# Altium schematic symbol library jlcpcb_2025_04_capacitors_extended_0603.schlib: 3668 symbols (part 15 of 20) (continued)
## GCM188R71E474KA64D
designator C?  Capacitance: 470nF  (hidden comment: *)
Capacitor, Ceramic (MLCC), 470nF, ±10%, 25V, X7R, ±10%, SMD 0603; Manufacturer: Murata Electronics; Manufacturer Part Number: GCM188R71E474KA64D; Package Size: 0603; JLCPCB Basic Part: No; JLCPCB Part Number: C161219; Supplier 1: LCSC; Category: Capacitors - MLCC; Supplier Part Number 1: C161219; Tolerance: ±10%; Voltage Rating: 25V; Temperature Coefficient: X7R; RoHS: Yes; ComponentLink1Description: Datasheet; ComponentLink1URL: https://wmsc.lcsc.com/wmsc/upload/file/pdf/v2/lcsc/1811021141_Murata-Electronics-GCM188R71E474KA64D_C161219.pdf; ComponentLink2Description: JLCPCB Part URL; ComponentLink2URL: https://jlcpcb.com/partdetail/C161219; ComponentLink3Description: LCSC Part URL; ComponentLink3URL: https://lcsc.com/product-detail/Multilayer-Ceramic-Capacitors-MLCC---SMD-SMT_Murata-Electronics-Murata-Electronics-GCM188R71E474KA64D_C161219.html
footprint CAP-0603 (0603 (1608M) Capacitor)
pins: 1, 2

## GCM188R71H102JA37D
designator C?  Capacitance: 1nF  (hidden comment: *)
Capacitor, Ceramic (MLCC), 1nF, ±5%, 50V, X7R, ±5%, SMD 0603; Manufacturer: Murata Electronics; Manufacturer Part Number: GCM188R71H102JA37D; Package Size: 0603; JLCPCB Basic Part: No; JLCPCB Part Number: C354355; Supplier 1: LCSC; Category: Capacitors - MLCC; Supplier Part Number 1: C354355; Tolerance: ±5%; Voltage Rating: 50V; Temperature Coefficient: X7R; RoHS: Yes; ComponentLink1Description: Datasheet; ComponentLink1URL: https://wmsc.lcsc.com/wmsc/upload/file/pdf/v2/lcsc/1912111437_Murata-Electronics-GCM188R71H102JA37D_C354355.pdf; ComponentLink2Description: JLCPCB Part URL; ComponentLink2URL: https://jlcpcb.com/partdetail/C354355; ComponentLink3Description: LCSC Part URL; ComponentLink3URL: https://lcsc.com/product-detail/Multilayer-Ceramic-Capacitors-MLCC---SMD-SMT_Murata-Electronics-Murata-Electronics-GCM188R71H102JA37D_C354355.html
footprint CAP-0603 (0603 (1608M) Capacitor)
pins: 1, 2

## GCM188R71H102KA37D
designator C?  Capacitance: 1nF  (hidden comment: *)
Capacitor, Ceramic (MLCC), 1nF, ±10%, 50V, X7R, ±10%, SMD 0603; Manufacturer: Murata Electronics; Manufacturer Part Number: GCM188R71H102KA37D; Package Size: 0603; JLCPCB Basic Part: No; JLCPCB Part Number: C161220; Supplier 1: LCSC; Category: Capacitors - MLCC; Supplier Part Number 1: C161220; Tolerance: ±10%; Voltage Rating: 50V; Temperature Coefficient: X7R; RoHS: Yes; ComponentLink1Description: Datasheet; ComponentLink1URL: https://wmsc.lcsc.com/wmsc/upload/file/pdf/v2/lcsc/1810311133_Murata-Electronics-GCM188R71H102KA37D_C161220.pdf; ComponentLink2Description: JLCPCB Part URL; ComponentLink2URL: https://jlcpcb.com/partdetail/C161220; ComponentLink3Description: LCSC Part URL; ComponentLink3URL: https://lcsc.com/product-detail/Multilayer-Ceramic-Capacitors-MLCC---SMD-SMT_Murata-Electronics-Murata-Electronics-GCM188R71H102KA37D_C161220.html
footprint CAP-0603 (0603 (1608M) Capacitor)
pins: 1, 2

## GCM188R71H103KA37D
designator C?  Capacitance: 10nF  (hidden comment: *)
Capacitor, Ceramic (MLCC), 10nF, ±10%, 50V, X7R, ±10%, SMD 0603; Manufacturer: Murata Electronics; Manufacturer Part Number: GCM188R71H103KA37D; Package Size: 0603; JLCPCB Basic Part: No; JLCPCB Part Number: C85863; Supplier 1: LCSC; Category: Capacitors - MLCC; Supplier Part Number 1: C85863; Tolerance: ±10%; Voltage Rating: 50V; Temperature Coefficient: X7R; RoHS: Yes; ComponentLink1Description: Datasheet; ComponentLink1URL: https://wmsc.lcsc.com/wmsc/upload/file/pdf/v2/lcsc/2304140030_Murata-Electronics-GCM188R71H103KA37D_C85863.pdf; ComponentLink2Description: JLCPCB Part URL; ComponentLink2URL: https://jlcpcb.com/partdetail/C85863; ComponentLink3Description: LCSC Part URL; ComponentLink3URL: https://lcsc.com/product-detail/Multilayer-Ceramic-Capacitors-MLCC---SMD-SMT_Murata-Electronics-Murata-Electronics-GCM188R71H103KA37D_C85863.html
footprint CAP-0603 (0603 (1608M) Capacitor)
pins: 1, 2

## GCM188R71H103KA37J
designator C?  Capacitance: 10000pF  (hidden comment: *)
Capacitor, Ceramic (MLCC), 10000pF, ±10%, null, ±10%, SMD 0603; Manufacturer: Murata Electronics; Manufacturer Part Number: GCM188R71H103KA37J; Package Size: 0603; JLCPCB Basic Part: No; JLCPCB Part Number: C3011665; Supplier 1: LCSC; Category: Capacitors - MLCC; Supplier Part Number 1: C3011665; Tolerance: ±10%; Voltage Rating: null; RoHS: Yes; ComponentLink1Description: Datasheet; ComponentLink1URL: https://wmsc.lcsc.com/wmsc/upload/file/pdf/v2/lcsc/2301111830_Murata-Electronics-GCM188R71H103KA37J_C3011665.pdf; ComponentLink2Description: JLCPCB Part URL; ComponentLink2URL: https://jlcpcb.com/partdetail/C3011665; ComponentLink3Description: LCSC Part URL; ComponentLink3URL: https://lcsc.com/product-detail/Multilayer-Ceramic-Capacitors-MLCC---SMD-SMT_Murata-Electronics-Murata-Electronics-GCM188R71H103KA37J_C3011665.html
footprint CAP-0603 (0603 (1608M) Capacitor)
pins: 1, 2

## GCM188R71H104JA57D
designator C?  Capacitance: 100nF  (hidden comment: *)
Capacitor, Ceramic (MLCC), 100nF, ±5%, 50V, X7R, ±5%, SMD 0603; Manufacturer: Murata Electronics; Manufacturer Part Number: GCM188R71H104JA57D; Package Size: 0603; JLCPCB Basic Part: No; JLCPCB Part Number: C393685; Supplier 1: LCSC; Category: Capacitors - MLCC; Supplier Part Number 1: C393685; Tolerance: ±5%; Voltage Rating: 50V; Temperature Coefficient: X7R; RoHS: Yes; ComponentLink1Description: Datasheet; ComponentLink1URL: https://wmsc.lcsc.com/wmsc/upload/file/pdf/v2/lcsc/1912111437_Murata-Electronics-GCM188R71H104JA57D_C393685.pdf; ComponentLink2Description: JLCPCB Part URL; ComponentLink2URL: https://jlcpcb.com/partdetail/C393685; ComponentLink3Description: LCSC Part URL; ComponentLink3URL: https://lcsc.com/product-detail/Multilayer-Ceramic-Capacitors-MLCC---SMD-SMT_Murata-Electronics-Murata-Electronics-GCM188R71H104JA57D_C393685.html
footprint CAP-0603 (0603 (1608M) Capacitor)
pins: 1, 2

## GCM188R71H104KA57D
designator C?  Capacitance: 100nF  (hidden comment: *)
Capacitor, Ceramic (MLCC), 100nF, ±10%, 50V, X7R, ±10%, SMD 0603; Manufacturer: Murata Electronics; Manufacturer Part Number: GCM188R71H104KA57D; Package Size: 0603; JLCPCB Basic Part: No; JLCPCB Part Number: C85864; Supplier 1: LCSC; Category: Capacitors - MLCC; Supplier Part Number 1: C85864; Tolerance: ±10%; Voltage Rating: 50V; Temperature Coefficient: X7R; RoHS: Yes; ComponentLink1Description: Datasheet; ComponentLink1URL: https://wmsc.lcsc.com/wmsc/upload/file/pdf/v2/lcsc/2304140030_Murata-Electronics-GCM188R71H104KA57D_C85864.pdf; ComponentLink2Description: JLCPCB Part URL; ComponentLink2URL: https://jlcpcb.com/partdetail/C85864; ComponentLink3Description: LCSC Part URL; ComponentLink3URL: https://lcsc.com/product-detail/Multilayer-Ceramic-Capacitors-MLCC---SMD-SMT_Murata-Electronics-Murata-Electronics-GCM188R71H104KA57D_C85864.html
footprint CAP-0603 (0603 (1608M) Capacitor)
pins: 1, 2

## GCM188R71H153KA37D
designator C?  Capacitance: 15nF  (hidden comment: *)
Capacitor, Ceramic (MLCC), 15nF, ±10%, 50V, X7R, ±10%, SMD 0603; Manufacturer: Murata Electronics; Manufacturer Part Number: GCM188R71H153KA37D; Package Size: 0603; JLCPCB Basic Part: No; JLCPCB Part Number: C426634; Supplier 1: LCSC; Category: Capacitors - MLCC; Supplier Part Number 1: C426634; Tolerance: ±10%; Voltage Rating: 50V; Temperature Coefficient: X7R; RoHS: Yes; ComponentLink1Description: Datasheet; ComponentLink1URL: https://wmsc.lcsc.com/wmsc/upload/file/pdf/v2/lcsc/2304140030_Murata-Electronics-GCM188R71H153KA37D_C426634.pdf; ComponentLink2Description: JLCPCB Part URL; ComponentLink2URL: https://jlcpcb.com/partdetail/C426634; ComponentLink3Description: LCSC Part URL; ComponentLink3URL: https://lcsc.com/product-detail/Multilayer-Ceramic-Capacitors-MLCC---SMD-SMT_Murata-Electronics-Murata-Electronics-GCM188R71H153KA37D_C426634.html
footprint CAP-0603 (0603 (1608M) Capacitor)
pins: 1, 2

## GCM188R71H154KA64D
designator C?  Capacitance: 150nF  (hidden comment: *)
Capacitor, Ceramic (MLCC), 150nF, ±10%, 50V, X7R, ±10%, SMD 0603; Manufacturer: Murata Electronics; Manufacturer Part Number: GCM188R71H154KA64D; Package Size: 0603; JLCPCB Basic Part: No; JLCPCB Part Number: C161224; Supplier 1: LCSC; Category: Capacitors - MLCC; Supplier Part Number 1: C161224; Tolerance: ±10%; Voltage Rating: 50V; Temperature Coefficient: X7R; RoHS: Yes; ComponentLink1Description: Datasheet; ComponentLink1URL: https://wmsc.lcsc.com/wmsc/upload/file/pdf/v2/lcsc/2304140030_Murata-Electronics-GCM188R71H154KA64D_C161224.pdf; ComponentLink2Description: JLCPCB Part URL; ComponentLink2URL: https://jlcpcb.com/partdetail/C161224; ComponentLink3Description: LCSC Part URL; ComponentLink3URL: https://lcsc.com/product-detail/Multilayer-Ceramic-Capacitors-MLCC---SMD-SMT_Murata-Electronics-Murata-Electronics-GCM188R71H154KA64D_C161224.html
footprint CAP-0603 (0603 (1608M) Capacitor)
pins: 1, 2

## GCM188R71H222JA37D
designator C?  Capacitance: 2.2nF  (hidden comment: *)
Capacitor, Ceramic (MLCC), 2.2nF, ±5%, 50V, X7R, ±5%, SMD 0603; Manufacturer: Murata Electronics; Manufacturer Part Number: GCM188R71H222JA37D; Package Size: 0603; JLCPCB Basic Part: No; JLCPCB Part Number: C354354; Supplier 1: LCSC; Category: Capacitors - MLCC; Supplier Part Number 1: C354354; Tolerance: ±5%; Voltage Rating: 50V; Temperature Coefficient: X7R; RoHS: Yes; ComponentLink1Description: Datasheet; ComponentLink1URL: https://wmsc.lcsc.com/wmsc/upload/file/pdf/v2/lcsc/1912111437_Murata-Electronics-GCM188R71H222JA37D_C354354.pdf; ComponentLink2Description: JLCPCB Part URL; ComponentLink2URL: https://jlcpcb.com/partdetail/C354354; ComponentLink3Description: LCSC Part URL; ComponentLink3URL: https://lcsc.com/product-detail/Multilayer-Ceramic-Capacitors-MLCC---SMD-SMT_Murata-Electronics-Murata-Electronics-GCM188R71H222JA37D_C354354.html
footprint CAP-0603 (0603 (1608M) Capacitor)
pins: 1, 2

## GCM188R71H223JA37D
designator C?  Capacitance: 22nF  (hidden comment: *)
Capacitor, Ceramic (MLCC), 22nF, ±5%, 50V, X7R, ±5%, SMD 0603; Manufacturer: Murata Electronics; Manufacturer Part Number: GCM188R71H223JA37D; Package Size: 0603; JLCPCB Basic Part: No; JLCPCB Part Number: C354353; Supplier 1: LCSC; Category: Capacitors - MLCC; Supplier Part Number 1: C354353; Tolerance: ±5%; Voltage Rating: 50V; Temperature Coefficient: X7R; RoHS: Yes; ComponentLink1Description: Datasheet; ComponentLink1URL: https://wmsc.lcsc.com/wmsc/upload/file/pdf/v2/lcsc/1912111437_Murata-Electronics-GCM188R71H223JA37D_C354353.pdf; ComponentLink2Description: JLCPCB Part URL; ComponentLink2URL: https://jlcpcb.com/partdetail/C354353; ComponentLink3Description: LCSC Part URL; ComponentLink3URL: https://lcsc.com/product-detail/Multilayer-Ceramic-Capacitors-MLCC---SMD-SMT_Murata-Electronics-Murata-Electronics-GCM188R71H223JA37D_C354353.html
footprint CAP-0603 (0603 (1608M) Capacitor)
pins: 1, 2

## GCM188R71H224KA64D
designator C?  Capacitance: 220nF  (hidden comment: *)
Capacitor, Ceramic (MLCC), 220nF, ±10%, 50V, X7R, ±10%, SMD 0603; Manufacturer: Murata Electronics; Manufacturer Part Number: GCM188R71H224KA64D; Package Size: 0603; JLCPCB Basic Part: No; JLCPCB Part Number: C97857; Supplier 1: LCSC; Category: Capacitors - MLCC; Supplier Part Number 1: C97857; Tolerance: ±10%; Voltage Rating: 50V; Temperature Coefficient: X7R; RoHS: Yes; ComponentLink1Description: Datasheet; ComponentLink1URL: https://wmsc.lcsc.com/wmsc/upload/file/pdf/v2/lcsc/1810311112_Murata-Electronics-GCM188R71H224KA64D_C97857.pdf; ComponentLink2Description: JLCPCB Part URL; ComponentLink2URL: https://jlcpcb.com/partdetail/C97857; ComponentLink3Description: LCSC Part URL; ComponentLink3URL: https://lcsc.com/product-detail/Multilayer-Ceramic-Capacitors-MLCC---SMD-SMT_Murata-Electronics-Murata-Electronics-GCM188R71H224KA64D_C97857.html
footprint CAP-0603 (0603 (1608M) Capacitor)
pins: 1, 2

## GCM188R71H224KA64J
designator C?  Capacitance: 220nF  (hidden comment: *)
Capacitor, Ceramic (MLCC), 220nF, ±10%, 50V, ±10%, SMD 0603; Manufacturer: Murata Electronics; Manufacturer Part Number: GCM188R71H224KA64J; Package Size: 0603; JLCPCB Basic Part: No; JLCPCB Part Number: C2169489; Supplier 1: LCSC; Category: Capacitors - MLCC; Supplier Part Number 1: C2169489; Tolerance: ±10%; Voltage Rating: 50V; RoHS: Yes; ComponentLink1Description: Datasheet; ComponentLink1URL: https://wmsc.lcsc.com/wmsc/upload/file/pdf/v2/lcsc/2308111606_Murata-Electronics-GCM188R71H224KA64J_C2169489.pdf; ComponentLink2Description: JLCPCB Part URL; ComponentLink2URL: https://jlcpcb.com/partdetail/C2169489; ComponentLink3Description: LCSC Part URL; ComponentLink3URL: https://lcsc.com/product-detail/Multilayer-Ceramic-Capacitors-MLCC---SMD-SMT_Murata-Electronics-Murata-Electronics-GCM188R71H224KA64J_C2169489.html
footprint CAP-0603 (0603 (1608M) Capacitor)
pins: 1, 2

## GCM188R71H272KA37D
designator C?  Capacitance: 2.7nF  (hidden comment: *)
Capacitor, Ceramic (MLCC), 2.7nF, ±10%, 50V, X7R, ±10%, SMD 0603; Manufacturer: Murata Electronics; Manufacturer Part Number: GCM188R71H272KA37D; Package Size: 0603; JLCPCB Basic Part: No; JLCPCB Part Number: C363931; Supplier 1: LCSC; Category: Capacitors - MLCC; Supplier Part Number 1: C363931; Tolerance: ±10%; Voltage Rating: 50V; Temperature Coefficient: X7R; RoHS: Yes; ComponentLink1Description: Datasheet; ComponentLink1URL: https://wmsc.lcsc.com/wmsc/upload/file/pdf/v2/lcsc/2304140030_Murata-Electronics-GCM188R71H272KA37D_C363931.pdf; ComponentLink2Description: JLCPCB Part URL; ComponentLink2URL: https://jlcpcb.com/partdetail/C363931; ComponentLink3Description: LCSC Part URL; ComponentLink3URL: https://lcsc.com/product-detail/Multilayer-Ceramic-Capacitors-MLCC---SMD-SMT_Murata-Electronics-Murata-Electronics-GCM188R71H272KA37D_C363931.html
footprint CAP-0603 (0603 (1608M) Capacitor)
pins: 1, 2

## GCM188R71H273KA55J
designator C?  Capacitance: 27nF  (hidden comment: *)
Capacitor, Ceramic (MLCC), 27nF, ±10%, 50V, X7R, ±10%, SMD 0603; Manufacturer: Murata Electronics; Manufacturer Part Number: GCM188R71H273KA55J; Package Size: 0603; JLCPCB Basic Part: No; JLCPCB Part Number: C426635; Supplier 1: LCSC; Category: Capacitors - MLCC; Supplier Part Number 1: C426635; Tolerance: ±10%; Voltage Rating: 50V; Temperature Coefficient: X7R; RoHS: Yes; ComponentLink1Description: Datasheet; ComponentLink1URL: https://wmsc.lcsc.com/wmsc/upload/file/pdf/v2/lcsc/2304140030_Murata-Electronics-GCM188R71H273KA55J_C426635.pdf; ComponentLink2Description: JLCPCB Part URL; ComponentLink2URL: https://jlcpcb.com/partdetail/C426635; ComponentLink3Description: LCSC Part URL; ComponentLink3URL: https://lcsc.com/product-detail/Multilayer-Ceramic-Capacitors-MLCC---SMD-SMT_Murata-Electronics-Murata-Electronics-GCM188R71H273KA55J_C426635.html
footprint CAP-0603 (0603 (1608M) Capacitor)
pins: 1, 2

## GCM188R71H682KA37D
designator C?  Capacitance: 6.8nF  (hidden comment: *)
Capacitor, Ceramic (MLCC), 6.8nF, ±10%, 50V, X7R, ±10%, SMD 0603; Manufacturer: Murata Electronics; Manufacturer Part Number: GCM188R71H682KA37D; Package Size: 0603; JLCPCB Basic Part: No; JLCPCB Part Number: C161230; Supplier 1: LCSC; Category: Capacitors - MLCC; Supplier Part Number 1: C161230; Tolerance: ±10%; Voltage Rating: 50V; Temperature Coefficient: X7R; RoHS: Yes; ComponentLink1Description: Datasheet; ComponentLink1URL: https://wmsc.lcsc.com/wmsc/upload/file/pdf/v2/lcsc/1810311134_Murata-Electronics-GCM188R71H682KA37D_C161230.pdf; ComponentLink2Description: JLCPCB Part URL; ComponentLink2URL: https://jlcpcb.com/partdetail/C161230; ComponentLink3Description: LCSC Part URL; ComponentLink3URL: https://lcsc.com/product-detail/Multilayer-Ceramic-Capacitors-MLCC---SMD-SMT_Murata-Electronics-Murata-Electronics-GCM188R71H682KA37D_C161230.html
footprint CAP-0603 (0603 (1608M) Capacitor)
pins: 1, 2

## GCM188R72A102KA37D
designator C?  Capacitance: 1nF  (hidden comment: *)
Capacitor, Ceramic (MLCC), 1nF, ±10%, 100V, X7R, ±10%, SMD 0603; Manufacturer: Murata Electronics; Manufacturer Part Number: GCM188R72A102KA37D; Package Size: 0603; JLCPCB Basic Part: No; JLCPCB Part Number: C161231; Supplier 1: LCSC; Category: Capacitors - MLCC; Supplier Part Number 1: C161231; Tolerance: ±10%; Voltage Rating: 100V; Temperature Coefficient: X7R; RoHS: Yes; ComponentLink1Description: Datasheet; ComponentLink1URL: https://wmsc.lcsc.com/wmsc/upload/file/pdf/v2/lcsc/1811081822_Murata-Electronics-GCM188R72A102KA37D_C161231.pdf; ComponentLink2Description: JLCPCB Part URL; ComponentLink2URL: https://jlcpcb.com/partdetail/C161231; ComponentLink3Description: LCSC Part URL; ComponentLink3URL: https://lcsc.com/product-detail/Multilayer-Ceramic-Capacitors-MLCC---SMD-SMT_Murata-Electronics-Murata-Electronics-GCM188R72A102KA37D_C161231.html
footprint CAP-0603 (0603 (1608M) Capacitor)
pins: 1, 2

## GCM188R72A103KA37D
designator C?  Capacitance: 10nF  (hidden comment: *)
Capacitor, Ceramic (MLCC), 10nF, ±10%, 100V, X7R, ±10%, SMD 0603; Manufacturer: Murata Electronics; Manufacturer Part Number: GCM188R72A103KA37D; Package Size: 0603; JLCPCB Basic Part: No; JLCPCB Part Number: C161232; Supplier 1: LCSC; Category: Capacitors - MLCC; Supplier Part Number 1: C161232; Tolerance: ±10%; Voltage Rating: 100V; Temperature Coefficient: X7R; RoHS: Yes; ComponentLink1Description: Datasheet; ComponentLink1URL: https://wmsc.lcsc.com/wmsc/upload/file/pdf/v2/lcsc/2304140030_Murata-Electronics-GCM188R72A103KA37D_C161232.pdf; ComponentLink2Description: JLCPCB Part URL; ComponentLink2URL: https://jlcpcb.com/partdetail/C161232; ComponentLink3Description: LCSC Part URL; ComponentLink3URL: https://lcsc.com/product-detail/Multilayer-Ceramic-Capacitors-MLCC---SMD-SMT_Murata-Electronics-Murata-Electronics-GCM188R72A103KA37D_C161232.html
footprint CAP-0603 (0603 (1608M) Capacitor)
pins: 1, 2

## GCM188R72A104KA64D
designator C?  Capacitance: 100nF  (hidden comment: *)
Capacitor, Ceramic (MLCC), 100nF, ±10%, 100V, X7R, ±10%, SMD 0603; Manufacturer: Murata Electronics; Manufacturer Part Number: GCM188R72A104KA64D; Package Size: 0603; JLCPCB Basic Part: No; JLCPCB Part Number: C415406; Supplier 1: LCSC; Category: Capacitors - MLCC; Supplier Part Number 1: C415406; Tolerance: ±10%; Voltage Rating: 100V; Temperature Coefficient: X7R; RoHS: Yes; ComponentLink1Description: Datasheet; ComponentLink1URL: https://wmsc.lcsc.com/wmsc/upload/file/pdf/v2/lcsc/2304140030_Murata-Electronics-GCM188R72A104KA64D_C415406.pdf; ComponentLink2Description: JLCPCB Part URL; ComponentLink2URL: https://jlcpcb.com/partdetail/C415406; ComponentLink3Description: LCSC Part URL; ComponentLink3URL: https://lcsc.com/product-detail/Multilayer-Ceramic-Capacitors-MLCC---SMD-SMT_Murata-Electronics-Murata-Electronics-GCM188R72A104KA64D_C415406.html
footprint CAP-0603 (0603 (1608M) Capacitor)
pins: 1, 2

## GCM188R72A153KA37D
designator C?  Capacitance: 15nF  (hidden comment: *)
Capacitor, Ceramic (MLCC), 15nF, ±10%, 100V, X7R, ±10%, SMD 0603; Manufacturer: Murata Electronics; Manufacturer Part Number: GCM188R72A153KA37D; Package Size: 0603; JLCPCB Basic Part: No; JLCPCB Part Number: C527994; Supplier 1: LCSC; Category: Capacitors - MLCC; Supplier Part Number 1: C527994; Tolerance: ±10%; Voltage Rating: 100V; Temperature Coefficient: X7R; RoHS: Yes; ComponentLink1Description: Datasheet; ComponentLink1URL: https://wmsc.lcsc.com/wmsc/upload/file/pdf/v2/lcsc/2007231033_Murata-Electronics-GCM188R72A153KA37D_C527994.pdf; ComponentLink2Description: JLCPCB Part URL; ComponentLink2URL: https://jlcpcb.com/partdetail/C527994; ComponentLink3Description: LCSC Part URL; ComponentLink3URL: https://lcsc.com/product-detail/Multilayer-Ceramic-Capacitors-MLCC---SMD-SMT_Murata-Electronics-Murata-Electronics-GCM188R72A153KA37D_C527994.html
footprint CAP-0603 (0603 (1608M) Capacitor)
pins: 1, 2

## GCM188R72A222KA37D
designator C?  Capacitance: 2.2nF  (hidden comment: *)
Capacitor, Ceramic (MLCC), 2.2nF, ±10%, 100V, X7R, ±10%, SMD 0603; Manufacturer: Murata Electronics; Manufacturer Part Number: GCM188R72A222KA37D; Package Size: 0603; JLCPCB Basic Part: No; JLCPCB Part Number: C408550; Supplier 1: LCSC; Category: Capacitors - MLCC; Supplier Part Number 1: C408550; Tolerance: ±10%; Voltage Rating: 100V; Temperature Coefficient: X7R; RoHS: Yes; ComponentLink1Description: Datasheet; ComponentLink1URL: https://wmsc.lcsc.com/wmsc/upload/file/pdf/v2/lcsc/2304140030_Murata-Electronics-GCM188R72A222KA37D_C408550.pdf; ComponentLink2Description: JLCPCB Part URL; ComponentLink2URL: https://jlcpcb.com/partdetail/C408550; ComponentLink3Description: LCSC Part URL; ComponentLink3URL: https://lcsc.com/product-detail/Multilayer-Ceramic-Capacitors-MLCC---SMD-SMT_Murata-Electronics-Murata-Electronics-GCM188R72A222KA37D_C408550.html
footprint CAP-0603 (0603 (1608M) Capacitor)
pins: 1, 2

## GCM188R72A223KA37D
designator C?  Capacitance: 22nF  (hidden comment: *)
Capacitor, Ceramic (MLCC), 22nF, ±10%, 100V, X7R, ±10%, SMD 0603; Manufacturer: Murata Electronics; Manufacturer Part Number: GCM188R72A223KA37D; Package Size: 0603; JLCPCB Basic Part: No; JLCPCB Part Number: C161234; Supplier 1: LCSC; Category: Capacitors - MLCC; Supplier Part Number 1: C161234; Tolerance: ±10%; Voltage Rating: 100V; Temperature Coefficient: X7R; RoHS: Yes; ComponentLink1Description: Datasheet; ComponentLink1URL: https://wmsc.lcsc.com/wmsc/upload/file/pdf/v2/lcsc/2304140030_Murata-Electronics-GCM188R72A223KA37D_C161234.pdf; ComponentLink2Description: JLCPCB Part URL; ComponentLink2URL: https://jlcpcb.com/partdetail/C161234; ComponentLink3Description: LCSC Part URL; ComponentLink3URL: https://lcsc.com/product-detail/Multilayer-Ceramic-Capacitors-MLCC---SMD-SMT_Murata-Electronics-Murata-Electronics-GCM188R72A223KA37D_C161234.html
footprint CAP-0603 (0603 (1608M) Capacitor)
pins: 1, 2

## GCM188R72A472KA37D
designator C?  Capacitance: 4.7nF  (hidden comment: *)
Capacitor, Ceramic (MLCC), 4.7nF, ±10%, 100V, X7R, ±10%, SMD 0603; Manufacturer: Murata Electronics; Manufacturer Part Number: GCM188R72A472KA37D; Package Size: 0603; JLCPCB Basic Part: No; JLCPCB Part Number: C426631; Supplier 1: LCSC; Category: Capacitors - MLCC; Supplier Part Number 1: C426631; Tolerance: ±10%; Voltage Rating: 100V; Temperature Coefficient: X7R; RoHS: Yes; ComponentLink1Description: Datasheet; ComponentLink1URL: https://wmsc.lcsc.com/wmsc/upload/file/pdf/v2/lcsc/2304140030_Murata-Electronics-GCM188R72A472KA37D_C426631.pdf; ComponentLink2Description: JLCPCB Part URL; ComponentLink2URL: https://jlcpcb.com/partdetail/C426631; ComponentLink3Description: LCSC Part URL; ComponentLink3URL: https://lcsc.com/product-detail/Multilayer-Ceramic-Capacitors-MLCC---SMD-SMT_Murata-Electronics-Murata-Electronics-GCM188R72A472KA37D_C426631.html
footprint CAP-0603 (0603 (1608M) Capacitor)
pins: 1, 2

## GCM188R72A682KA37D
designator C?  Capacitance: 6.8nF  (hidden comment: *)
Capacitor, Ceramic (MLCC), 6.8nF, ±10%, 100V, ±10%, SMD 0603; Manufacturer: Murata Electronics; Manufacturer Part Number: GCM188R72A682KA37D; Package Size: 0603; JLCPCB Basic Part: No; JLCPCB Part Number: C576423; Supplier 1: LCSC; Category: Capacitors - MLCC; Supplier Part Number 1: C576423; Tolerance: ±10%; Voltage Rating: 100V; RoHS: Yes; ComponentLink1Description: Datasheet; ComponentLink1URL: https://wmsc.lcsc.com/wmsc/upload/file/pdf/v2/lcsc/2105241310_Murata-Electronics-GCM188R72A682KA37D_C576423.pdf; ComponentLink2Description: JLCPCB Part URL; ComponentLink2URL: https://jlcpcb.com/partdetail/C576423; ComponentLink3Description: LCSC Part URL; ComponentLink3URL: https://lcsc.com/product-detail/Multilayer-Ceramic-Capacitors-MLCC---SMD-SMT_Murata-Electronics-Murata-Electronics-GCM188R72A682KA37D_C576423.html
footprint CAP-0603 (0603 (1608M) Capacitor)
pins: 1, 2

## GCM188R91E104KA37D
designator C?  Capacitance: 100nF  (hidden comment: *)
Capacitor, Ceramic (MLCC), 100nF, ±10%, 25V, ±10%, SMD 0603; Manufacturer: Murata Electronics; Manufacturer Part Number: GCM188R91E104KA37D; Package Size: 0603; JLCPCB Basic Part: No; JLCPCB Part Number: C913534; Supplier 1: LCSC; Category: Capacitors - MLCC; Supplier Part Number 1: C913534; Tolerance: ±10%; Voltage Rating: 25V; RoHS: Yes; ComponentLink1Description: Datasheet; ComponentLink1URL: https://wmsc.lcsc.com/wmsc/upload/file/pdf/v2/lcsc/2304140030_Murata-Electronics-GCM188R91E104KA37D_C913534.pdf; ComponentLink2Description: JLCPCB Part URL; ComponentLink2URL: https://jlcpcb.com/partdetail/C913534; ComponentLink3Description: LCSC Part URL; ComponentLink3URL: https://lcsc.com/product-detail/Multilayer-Ceramic-Capacitors-MLCC---SMD-SMT_Murata-Electronics-Murata-Electronics-GCM188R91E104KA37D_C913534.html
footprint CAP-0603 (0603 (1608M) Capacitor)
pins: 1, 2

## GCM188R91H102KA37D
designator C?  Capacitance: 1nF  (hidden comment: *)
Capacitor, Ceramic (MLCC), 1nF, ±10%, 50V, X8R, ±10%, SMD 0603; Manufacturer: Murata Electronics; Manufacturer Part Number: GCM188R91H102KA37D; Package Size: 0603; JLCPCB Basic Part: No; JLCPCB Part Number: C161235; Supplier 1: LCSC; Category: Capacitors - MLCC; Supplier Part Number 1: C161235; Tolerance: ±10%; Voltage Rating: 50V; Temperature Coefficient: X8R; RoHS: Yes; ComponentLink1Description: Datasheet; ComponentLink1URL: https://wmsc.lcsc.com/wmsc/upload/file/pdf/v2/lcsc/1810311126_Murata-Electronics-GCM188R91H102KA37D_C161235.pdf; ComponentLink2Description: JLCPCB Part URL; ComponentLink2URL: https://jlcpcb.com/partdetail/C161235; ComponentLink3Description: LCSC Part URL; ComponentLink3URL: https://lcsc.com/product-detail/Multilayer-Ceramic-Capacitors-MLCC---SMD-SMT_Murata-Electronics-Murata-Electronics-GCM188R91H102KA37D_C161235.html
footprint CAP-0603 (0603 (1608M) Capacitor)
pins: 1, 2

## GCM188R91H103KA37D
designator C?  Capacitance: 10nF  (hidden comment: *)
Capacitor, Ceramic (MLCC), 10nF, ±10%, 50V, X8R, ±10%, SMD 0603; Manufacturer: Murata Electronics; Manufacturer Part Number: GCM188R91H103KA37D; Package Size: 0603; JLCPCB Basic Part: No; JLCPCB Part Number: C710687; Supplier 1: LCSC; Category: Capacitors - MLCC; Supplier Part Number 1: C710687; Tolerance: ±10%; Voltage Rating: 50V; Temperature Coefficient: X8R; RoHS: Yes; ComponentLink1Description: Datasheet; ComponentLink1URL: https://wmsc.lcsc.com/wmsc/upload/file/pdf/v2/lcsc/2210190600_Murata-Electronics-GCM188R91H103KA37D_C710687.pdf; ComponentLink2Description: JLCPCB Part URL; ComponentLink2URL: https://jlcpcb.com/partdetail/C710687; ComponentLink3Description: LCSC Part URL; ComponentLink3URL: https://lcsc.com/product-detail/Multilayer-Ceramic-Capacitors-MLCC---SMD-SMT_Murata-Electronics-Murata-Electronics-GCM188R91H103KA37D_C710687.html
footprint CAP-0603 (0603 (1608M) Capacitor)
pins: 1, 2

## GCM188R91H222KA37D
designator C?  Capacitance: 2200pF  (hidden comment: *)
Capacitor, Ceramic (MLCC), 2200pF, ±10%, 50V, X8R, ±10%, SMD 0603; Manufacturer: Murata Electronics; Manufacturer Part Number: GCM188R91H222KA37D; Package Size: 0603; JLCPCB Basic Part: No; JLCPCB Part Number: C701271; Supplier 1: LCSC; Category: Capacitors - MLCC; Supplier Part Number 1: C701271; Tolerance: ±10%; Voltage Rating: 50V; Temperature Coefficient: X8R; RoHS: Yes; ComponentLink1Description: Datasheet; ComponentLink1URL: https://wmsc.lcsc.com/wmsc/upload/file/pdf/v2/lcsc/2304140030_Murata-Electronics-GCM188R91H222KA37D_C701271.pdf; ComponentLink2Description: JLCPCB Part URL; ComponentLink2URL: https://jlcpcb.com/partdetail/C701271; ComponentLink3Description: LCSC Part URL; ComponentLink3URL: https://lcsc.com/product-detail/Multilayer-Ceramic-Capacitors-MLCC---SMD-SMT_Murata-Electronics-Murata-Electronics-GCM188R91H222KA37D_C701271.html
footprint CAP-0603 (0603 (1608M) Capacitor)
pins: 1, 2

## GCM188R91H223KA37D
designator C?  Capacitance: 22nF  (hidden comment: *)
Capacitor, Ceramic (MLCC), 22nF, ±10%, 50V, X8R, ±10%, SMD 0603; Manufacturer: Murata Electronics; Manufacturer Part Number: GCM188R91H223KA37D; Package Size: 0603; JLCPCB Basic Part: No; JLCPCB Part Number: C710688; Supplier 1: LCSC; Category: Capacitors - MLCC; Supplier Part Number 1: C710688; Tolerance: ±10%; Voltage Rating: 50V; Temperature Coefficient: X8R; RoHS: Yes; ComponentLink1Description: Datasheet; ComponentLink1URL: https://wmsc.lcsc.com/wmsc/upload/file/pdf/v2/lcsc/2308111606_Murata-Electronics-GCM188R91H223KA37D_C710688.pdf; ComponentLink2Description: JLCPCB Part URL; ComponentLink2URL: https://jlcpcb.com/partdetail/C710688; ComponentLink3Description: LCSC Part URL; ComponentLink3URL: https://lcsc.com/product-detail/Multilayer-Ceramic-Capacitors-MLCC---SMD-SMT_Murata-Electronics-Murata-Electronics-GCM188R91H223KA37D_C710688.html
footprint CAP-0603 (0603 (1608M) Capacitor)
pins: 1, 2

## GCM188R91H472KA37D
designator C?  Capacitance: 4.7nF  (hidden comment: *)
Capacitor, Ceramic (MLCC), 4.7nF, ±10%, 50V, X8R, ±10%, SMD 0603; Manufacturer: Murata Electronics; Manufacturer Part Number: GCM188R91H472KA37D; Package Size: 0603; JLCPCB Basic Part: No; JLCPCB Part Number: C524555; Supplier 1: LCSC; Category: Capacitors - MLCC; Supplier Part Number 1: C524555; Tolerance: ±10%; Voltage Rating: 50V; Temperature Coefficient: X8R; RoHS: Yes; ComponentLink1Description: Datasheet; ComponentLink1URL: https://wmsc.lcsc.com/wmsc/upload/file/pdf/v2/lcsc/2304140030_Murata-Electronics-GCM188R91H472KA37D_C524555.pdf; ComponentLink2Description: JLCPCB Part URL; ComponentLink2URL: https://jlcpcb.com/partdetail/C524555; ComponentLink3Description: LCSC Part URL; ComponentLink3URL: https://lcsc.com/product-detail/Multilayer-Ceramic-Capacitors-MLCC---SMD-SMT_Murata-Electronics-Murata-Electronics-GCM188R91H472KA37D_C524555.html
footprint CAP-0603 (0603 (1608M) Capacitor)
pins: 1, 2

## GCM188R91H473KA37D
designator C?  Capacitance: 47nF  (hidden comment: *)
Capacitor, Ceramic (MLCC), 47nF, ±10%, null, X8R, ±10%, SMD 0603; Manufacturer: Murata Electronics; Manufacturer Part Number: GCM188R91H473KA37D; Package Size: 0603; JLCPCB Basic Part: No; JLCPCB Part Number: C701262; Supplier 1: LCSC; Category: Capacitors - MLCC; Supplier Part Number 1: C701262; Tolerance: ±10%; Voltage Rating: null; Temperature Coefficient: X8R; RoHS: Yes; ComponentLink1Description: Datasheet; ComponentLink1URL: https://wmsc.lcsc.com/wmsc/upload/file/pdf/v2/lcsc/2304140030_Murata-Electronics-GCM188R91H473KA37D_C701262.pdf; ComponentLink2Description: JLCPCB Part URL; ComponentLink2URL: https://jlcpcb.com/partdetail/C701262; ComponentLink3Description: LCSC Part URL; ComponentLink3URL: https://lcsc.com/product-detail/Multilayer-Ceramic-Capacitors-MLCC---SMD-SMT_Murata-Electronics-Murata-Electronics-GCM188R91H473KA37D_C701262.html
footprint CAP-0603 (0603 (1608M) Capacitor)
pins: 1, 2

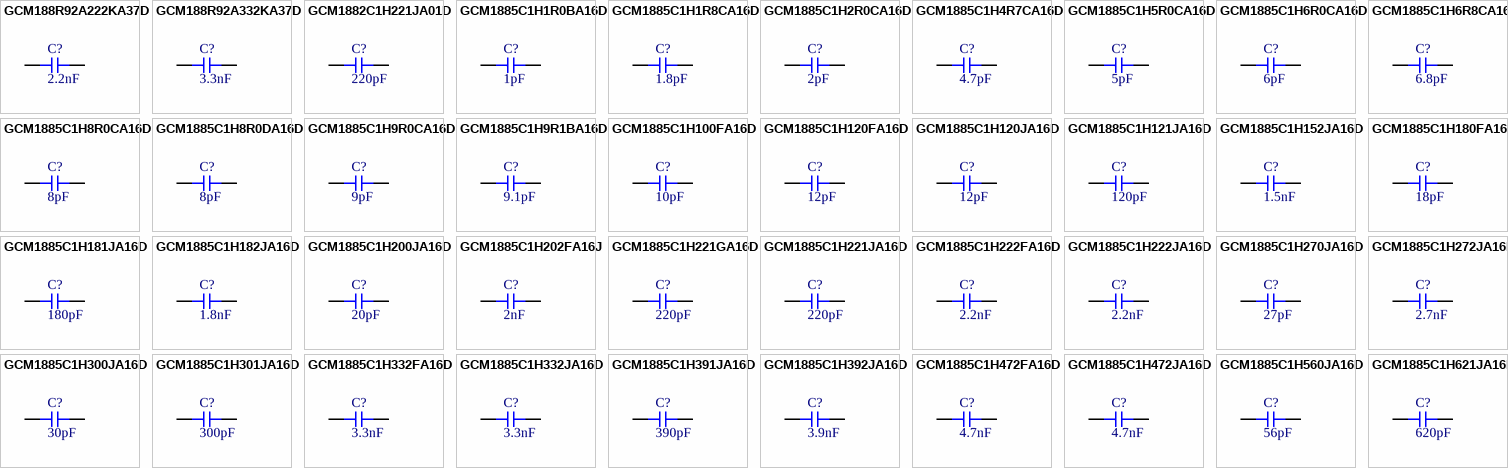
[diagram p69: symbols GCM188R92A222KA37D to GCM1885C1H621JA16D]

## GCM188R92A222KA37D
designator C?  Capacitance: 2.2nF  (hidden comment: *)
Capacitor, Ceramic (MLCC), 2.2nF, ±10%, 100V, X8R, ±10%, SMD 0603; Manufacturer: Murata Electronics; Manufacturer Part Number: GCM188R92A222KA37D; Package Size: 0603; JLCPCB Basic Part: No; JLCPCB Part Number: C2205571; Supplier 1: LCSC; Category: Capacitors - MLCC; Supplier Part Number 1: C2205571; Tolerance: ±10%; Voltage Rating: 100V; Temperature Coefficient: X8R; RoHS: Yes; ComponentLink1Description: Datasheet; ComponentLink1URL: https://wmsc.lcsc.com/wmsc/upload/file/pdf/v2/lcsc/2104171417_Murata-Electronics-GCM188R92A222KA37D_C2205571.pdf; ComponentLink2Description: JLCPCB Part URL; ComponentLink2URL: https://jlcpcb.com/partdetail/C2205571; ComponentLink3Description: LCSC Part URL; ComponentLink3URL: https://lcsc.com/product-detail/Multilayer-Ceramic-Capacitors-MLCC---SMD-SMT_Murata-Electronics-Murata-Electronics-GCM188R92A222KA37D_C2205571.html
footprint CAP-0603 (0603 (1608M) Capacitor)
pins: 1, 2

## GCM188R92A332KA37D
designator C?  Capacitance: 3.3nF  (hidden comment: *)
Capacitor, Ceramic (MLCC), 3.3nF, ±10%, 100V, X8R, ±10%, SMD 0603; Manufacturer: Murata Electronics; Manufacturer Part Number: GCM188R92A332KA37D; Package Size: 0603; JLCPCB Basic Part: No; JLCPCB Part Number: C2891590; Supplier 1: LCSC; Category: Capacitors - MLCC; Supplier Part Number 1: C2891590; Tolerance: ±10%; Voltage Rating: 100V; Temperature Coefficient: X8R; RoHS: Yes; ComponentLink1Description: Datasheet; ComponentLink1URL: https://wmsc.lcsc.com/wmsc/upload/file/pdf/v2/lcsc/2207251801_Murata-Electronics-GCM188R92A332KA37D_C2891590.pdf; ComponentLink2Description: JLCPCB Part URL; ComponentLink2URL: https://jlcpcb.com/partdetail/C2891590; ComponentLink3Description: LCSC Part URL; ComponentLink3URL: https://lcsc.com/product-detail/Multilayer-Ceramic-Capacitors-MLCC---SMD-SMT_Murata-Electronics-Murata-Electronics-GCM188R92A332KA37D_C2891590.html
footprint CAP-0603 (0603 (1608M) Capacitor)
pins: 1, 2

## GCM1882C1H221JA01D
designator C?  Capacitance: 220pF  (hidden comment: *)
Capacitor, Ceramic (MLCC), 220pF, ±5%, 50V, CH, ±5%, SMD 0603; Manufacturer: Murata Electronics; Manufacturer Part Number: GCM1882C1H221JA01D; Package Size: 0603; JLCPCB Basic Part: No; JLCPCB Part Number: C126540; Supplier 1: LCSC; Category: Capacitors - MLCC; Supplier Part Number 1: C126540; Tolerance: ±5%; Voltage Rating: 50V; Temperature Coefficient: CH; RoHS: Yes; ComponentLink1Description: Datasheet; ComponentLink2Description: JLCPCB Part URL; ComponentLink2URL: https://jlcpcb.com/partdetail/C126540; ComponentLink3Description: LCSC Part URL; ComponentLink3URL: https://lcsc.com/product-detail/Multilayer-Ceramic-Capacitors-MLCC---SMD-SMT_Murata-Electronics-Murata-Electronics-GCM1882C1H221JA01D_C126540.html
footprint CAP-0603 (0603 (1608M) Capacitor)
pins: 1, 2

## GCM1885C1H1R0BA16D
designator C?  Capacitance: 1pF  (hidden comment: *)
Capacitor, Ceramic (MLCC), 1pF, 50V, C0G, SMD 0603; Manufacturer: Murata Electronics; Manufacturer Part Number: GCM1885C1H1R0BA16D; Package Size: 0603; JLCPCB Basic Part: No; JLCPCB Part Number: C437451; Supplier 1: LCSC; Category: Capacitors - MLCC; Supplier Part Number 1: C437451; Voltage Rating: 50V; Temperature Coefficient: C0G; RoHS: Yes; ComponentLink1Description: Datasheet; ComponentLink1URL: https://wmsc.lcsc.com/wmsc/upload/file/pdf/v2/lcsc/2304140030_Murata-Electronics-GCM1885C1H1R0BA16D_C437451.pdf; ComponentLink2Description: JLCPCB Part URL; ComponentLink2URL: https://jlcpcb.com/partdetail/C437451; ComponentLink3Description: LCSC Part URL; ComponentLink3URL: https://lcsc.com/product-detail/Multilayer-Ceramic-Capacitors-MLCC---SMD-SMT_Murata-Electronics-Murata-Electronics-GCM1885C1H1R0BA16D_C437451.html
footprint CAP-0603 (0603 (1608M) Capacitor)
pins: 1, 2

## GCM1885C1H1R8CA16D
designator C?  Capacitance: 1.8pF  (hidden comment: *)
Capacitor, Ceramic (MLCC), 1.8pF, 50V, C0G, SMD 0603; Manufacturer: Murata Electronics; Manufacturer Part Number: GCM1885C1H1R8CA16D; Package Size: 0603; JLCPCB Basic Part: No; JLCPCB Part Number: C161176; Supplier 1: LCSC; Category: Capacitors - MLCC; Supplier Part Number 1: C161176; Voltage Rating: 50V; Temperature Coefficient: C0G; RoHS: Yes; ComponentLink1Description: Datasheet; ComponentLink1URL: https://wmsc.lcsc.com/wmsc/upload/file/pdf/v2/lcsc/2304140030_Murata-Electronics-GCM1885C1H1R8CA16D_C161176.pdf; ComponentLink2Description: JLCPCB Part URL; ComponentLink2URL: https://jlcpcb.com/partdetail/C161176; ComponentLink3Description: LCSC Part URL; ComponentLink3URL: https://lcsc.com/product-detail/Multilayer-Ceramic-Capacitors-MLCC---SMD-SMT_Murata-Electronics-Murata-Electronics-GCM1885C1H1R8CA16D_C161176.html
footprint CAP-0603 (0603 (1608M) Capacitor)
pins: 1, 2

## GCM1885C1H2R0CA16D
designator C?  Capacitance: 2pF  (hidden comment: *)
Capacitor, Ceramic (MLCC), 2pF, 50V, C0G, SMD 0603; Manufacturer: Murata Electronics; Manufacturer Part Number: GCM1885C1H2R0CA16D; Package Size: 0603; JLCPCB Basic Part: No; JLCPCB Part Number: C126559; Supplier 1: LCSC; Category: Capacitors - MLCC; Supplier Part Number 1: C126559; Voltage Rating: 50V; Temperature Coefficient: C0G; RoHS: Yes; ComponentLink1Description: Datasheet; ComponentLink1URL: https://wmsc.lcsc.com/wmsc/upload/file/pdf/v2/lcsc/1810311141_Murata-Electronics-GCM1885C1H2R0CA16D_C126559.pdf; ComponentLink2Description: JLCPCB Part URL; ComponentLink2URL: https://jlcpcb.com/partdetail/C126559; ComponentLink3Description: LCSC Part URL; ComponentLink3URL: https://lcsc.com/product-detail/Multilayer-Ceramic-Capacitors-MLCC---SMD-SMT_Murata-Electronics-Murata-Electronics-GCM1885C1H2R0CA16D_C126559.html
footprint CAP-0603 (0603 (1608M) Capacitor)
pins: 1, 2

## GCM1885C1H4R7CA16D
designator C?  Capacitance: 4.7pF  (hidden comment: *)
Capacitor, Ceramic (MLCC), 4.7pF, 50V, SMD 0603; Manufacturer: Murata Electronics; Manufacturer Part Number: GCM1885C1H4R7CA16D; Package Size: 0603; JLCPCB Basic Part: No; JLCPCB Part Number: C161179; Supplier 1: LCSC; Category: Capacitors - MLCC; Supplier Part Number 1: C161179; Voltage Rating: 50V; RoHS: Yes; ComponentLink1Description: Datasheet; ComponentLink1URL: https://wmsc.lcsc.com/wmsc/upload/file/pdf/v2/lcsc/2010221636_Murata-Electronics-GCM1885C1H4R7CA16D_C161179.pdf; ComponentLink2Description: JLCPCB Part URL; ComponentLink2URL: https://jlcpcb.com/partdetail/C161179; ComponentLink3Description: LCSC Part URL; ComponentLink3URL: https://lcsc.com/product-detail/Multilayer-Ceramic-Capacitors-MLCC---SMD-SMT_Murata-Electronics-Murata-Electronics-GCM1885C1H4R7CA16D_C161179.html
footprint CAP-0603 (0603 (1608M) Capacitor)
pins: 1, 2

## GCM1885C1H5R0CA16D
designator C?  Capacitance: 5pF  (hidden comment: *)
Capacitor, Ceramic (MLCC), 5pF, 50V, C0G, SMD 0603; Manufacturer: Murata Electronics; Manufacturer Part Number: GCM1885C1H5R0CA16D; Package Size: 0603; JLCPCB Basic Part: No; JLCPCB Part Number: C393689; Supplier 1: LCSC; Category: Capacitors - MLCC; Supplier Part Number 1: C393689; Voltage Rating: 50V; Temperature Coefficient: C0G; RoHS: Yes; ComponentLink1Description: Datasheet; ComponentLink1URL: https://wmsc.lcsc.com/wmsc/upload/file/pdf/v2/lcsc/1912111437_Murata-Electronics-GCM1885C1H5R0CA16D_C393689.pdf; ComponentLink2Description: JLCPCB Part URL; ComponentLink2URL: https://jlcpcb.com/partdetail/C393689; ComponentLink3Description: LCSC Part URL; ComponentLink3URL: https://lcsc.com/product-detail/Multilayer-Ceramic-Capacitors-MLCC---SMD-SMT_Murata-Electronics-Murata-Electronics-GCM1885C1H5R0CA16D_C393689.html
footprint CAP-0603 (0603 (1608M) Capacitor)
pins: 1, 2

## GCM1885C1H6R0CA16D
designator C?  Capacitance: 6pF  (hidden comment: *)
Capacitor, Ceramic (MLCC), 6pF, 50V, C0G, SMD 0603; Manufacturer: Murata Electronics; Manufacturer Part Number: GCM1885C1H6R0CA16D; Package Size: 0603; JLCPCB Basic Part: No; JLCPCB Part Number: C354359; Supplier 1: LCSC; Category: Capacitors - MLCC; Supplier Part Number 1: C354359; Voltage Rating: 50V; Temperature Coefficient: C0G; RoHS: Yes; ComponentLink1Description: Datasheet; ComponentLink1URL: https://wmsc.lcsc.com/wmsc/upload/file/pdf/v2/lcsc/1912111437_Murata-Electronics-GCM1885C1H6R0CA16D_C354359.pdf; ComponentLink2Description: JLCPCB Part URL; ComponentLink2URL: https://jlcpcb.com/partdetail/C354359; ComponentLink3Description: LCSC Part URL; ComponentLink3URL: https://lcsc.com/product-detail/Multilayer-Ceramic-Capacitors-MLCC---SMD-SMT_Murata-Electronics-Murata-Electronics-GCM1885C1H6R0CA16D_C354359.html
footprint CAP-0603 (0603 (1608M) Capacitor)
pins: 1, 2

## GCM1885C1H6R8CA16D
designator C?  Capacitance: 6.8pF  (hidden comment: *)
Capacitor, Ceramic (MLCC), 6.8pF, 50V, C0G, SMD 0603; Manufacturer: Murata Electronics; Manufacturer Part Number: GCM1885C1H6R8CA16D; Package Size: 0603; JLCPCB Basic Part: No; JLCPCB Part Number: C430704; Supplier 1: LCSC; Category: Capacitors - MLCC; Supplier Part Number 1: C430704; Voltage Rating: 50V; Temperature Coefficient: C0G; RoHS: Yes; ComponentLink1Description: Datasheet; ComponentLink1URL: https://wmsc.lcsc.com/wmsc/upload/file/pdf/v2/lcsc/2304140030_Murata-Electronics-GCM1885C1H6R8CA16D_C430704.pdf; ComponentLink2Description: JLCPCB Part URL; ComponentLink2URL: https://jlcpcb.com/partdetail/C430704; ComponentLink3Description: LCSC Part URL; ComponentLink3URL: https://lcsc.com/product-detail/Multilayer-Ceramic-Capacitors-MLCC---SMD-SMT_Murata-Electronics-Murata-Electronics-GCM1885C1H6R8CA16D_C430704.html
footprint CAP-0603 (0603 (1608M) Capacitor)
pins: 1, 2

## GCM1885C1H8R0CA16D
designator C?  Capacitance: 8pF  (hidden comment: *)
Capacitor, Ceramic (MLCC), 8pF, 50V, C0G, SMD 0603; Manufacturer: Murata Electronics; Manufacturer Part Number: GCM1885C1H8R0CA16D; Package Size: 0603; JLCPCB Basic Part: No; JLCPCB Part Number: C426648; Supplier 1: LCSC; Category: Capacitors - MLCC; Supplier Part Number 1: C426648; Voltage Rating: 50V; Temperature Coefficient: C0G; RoHS: Yes; ComponentLink1Description: Datasheet; ComponentLink1URL: https://wmsc.lcsc.com/wmsc/upload/file/pdf/v2/lcsc/2304140030_Murata-Electronics-GCM1885C1H8R0CA16D_C426648.pdf; ComponentLink2Description: JLCPCB Part URL; ComponentLink2URL: https://jlcpcb.com/partdetail/C426648; ComponentLink3Description: LCSC Part URL; ComponentLink3URL: https://lcsc.com/product-detail/Multilayer-Ceramic-Capacitors-MLCC---SMD-SMT_Murata-Electronics-Murata-Electronics-GCM1885C1H8R0CA16D_C426648.html
footprint CAP-0603 (0603 (1608M) Capacitor)
pins: 1, 2

## GCM1885C1H8R0DA16D
designator C?  Capacitance: 8pF  (hidden comment: *)
Capacitor, Ceramic (MLCC), 8pF, 50V, C0G, SMD 0603; Manufacturer: Murata Electronics; Manufacturer Part Number: GCM1885C1H8R0DA16D; Package Size: 0603; JLCPCB Basic Part: No; JLCPCB Part Number: C363944; Supplier 1: LCSC; Category: Capacitors - MLCC; Supplier Part Number 1: C363944; Voltage Rating: 50V; Temperature Coefficient: C0G; RoHS: Yes; ComponentLink1Description: Datasheet; ComponentLink1URL: https://wmsc.lcsc.com/wmsc/upload/file/pdf/v2/lcsc/2304140030_Murata-Electronics-GCM1885C1H8R0DA16D_C363944.pdf; ComponentLink2Description: JLCPCB Part URL; ComponentLink2URL: https://jlcpcb.com/partdetail/C363944; ComponentLink3Description: LCSC Part URL; ComponentLink3URL: https://lcsc.com/product-detail/Multilayer-Ceramic-Capacitors-MLCC---SMD-SMT_Murata-Electronics-Murata-Electronics-GCM1885C1H8R0DA16D_C363944.html
footprint CAP-0603 (0603 (1608M) Capacitor)
pins: 1, 2

## GCM1885C1H9R0CA16D
designator C?  Capacitance: 9pF  (hidden comment: *)
Capacitor, Ceramic (MLCC), 9pF, 50V, C0G, SMD 0603; Manufacturer: Murata Electronics; Manufacturer Part Number: GCM1885C1H9R0CA16D; Package Size: 0603; JLCPCB Basic Part: No; JLCPCB Part Number: C161180; Supplier 1: LCSC; Category: Capacitors - MLCC; Supplier Part Number 1: C161180; Voltage Rating: 50V; Temperature Coefficient: C0G; RoHS: Yes; ComponentLink1Description: Datasheet; ComponentLink1URL: https://wmsc.lcsc.com/wmsc/upload/file/pdf/v2/lcsc/2304140030_Murata-Electronics-GCM1885C1H9R0CA16D_C161180.pdf; ComponentLink2Description: JLCPCB Part URL; ComponentLink2URL: https://jlcpcb.com/partdetail/C161180; ComponentLink3Description: LCSC Part URL; ComponentLink3URL: https://lcsc.com/product-detail/Multilayer-Ceramic-Capacitors-MLCC---SMD-SMT_Murata-Electronics-Murata-Electronics-GCM1885C1H9R0CA16D_C161180.html
footprint CAP-0603 (0603 (1608M) Capacitor)
pins: 1, 2

## GCM1885C1H9R1BA16D
designator C?  Capacitance: 9.1pF  (hidden comment: *)
Capacitor, Ceramic (MLCC), 9.1pF, 50V, SMD 0603; Manufacturer: Murata Electronics; Manufacturer Part Number: GCM1885C1H9R1BA16D; Package Size: 0603; JLCPCB Basic Part: No; JLCPCB Part Number: C913437; Supplier 1: LCSC; Category: Capacitors - MLCC; Supplier Part Number 1: C913437; Voltage Rating: 50V; RoHS: Yes; ComponentLink1Description: Datasheet; ComponentLink1URL: https://wmsc.lcsc.com/wmsc/upload/file/pdf/v2/lcsc/2201131300_Murata-Electronics-GCM1885C1H9R1BA16D_C913437.pdf; ComponentLink2Description: JLCPCB Part URL; ComponentLink2URL: https://jlcpcb.com/partdetail/C913437; ComponentLink3Description: LCSC Part URL; ComponentLink3URL: https://lcsc.com/product-detail/Multilayer-Ceramic-Capacitors-MLCC---SMD-SMT_Murata-Electronics-Murata-Electronics-GCM1885C1H9R1BA16D_C913437.html
footprint CAP-0603 (0603 (1608M) Capacitor)
pins: 1, 2

## GCM1885C1H100FA16D
designator C?  Capacitance: 10pF  (hidden comment: *)
Capacitor, Ceramic (MLCC), 10pF, ±1%, 50V, C0G, ±1%, SMD 0603; Manufacturer: Murata Electronics; Manufacturer Part Number: GCM1885C1H100FA16D; Package Size: 0603; JLCPCB Basic Part: No; JLCPCB Part Number: C126541; Supplier 1: LCSC; Category: Capacitors - MLCC; Supplier Part Number 1: C126541; Tolerance: ±1%; Voltage Rating: 50V; Temperature Coefficient: C0G; RoHS: Yes; ComponentLink1Description: Datasheet; ComponentLink1URL: https://wmsc.lcsc.com/wmsc/upload/file/pdf/v2/lcsc/1810311141_Murata-Electronics-GCM1885C1H100FA16D_C126541.pdf; ComponentLink2Description: JLCPCB Part URL; ComponentLink2URL: https://jlcpcb.com/partdetail/C126541; ComponentLink3Description: LCSC Part URL; ComponentLink3URL: https://lcsc.com/product-detail/Multilayer-Ceramic-Capacitors-MLCC---SMD-SMT_Murata-Electronics-Murata-Electronics-GCM1885C1H100FA16D_C126541.html
footprint CAP-0603 (0603 (1608M) Capacitor)
pins: 1, 2

## GCM1885C1H120FA16D
designator C?  Capacitance: 12pF  (hidden comment: *)
Capacitor, Ceramic (MLCC), 12pF, ±1%, 50V, C0G, ±1%, SMD 0603; Manufacturer: Murata Electronics; Manufacturer Part Number: GCM1885C1H120FA16D; Package Size: 0603; JLCPCB Basic Part: No; JLCPCB Part Number: C126545; Supplier 1: LCSC; Category: Capacitors - MLCC; Supplier Part Number 1: C126545; Tolerance: ±1%; Voltage Rating: 50V; Temperature Coefficient: C0G; RoHS: Yes; ComponentLink1Description: Datasheet; ComponentLink1URL: https://wmsc.lcsc.com/wmsc/upload/file/pdf/v2/lcsc/1810311141_Murata-Electronics-GCM1885C1H120FA16D_C126545.pdf; ComponentLink2Description: JLCPCB Part URL; ComponentLink2URL: https://jlcpcb.com/partdetail/C126545; ComponentLink3Description: LCSC Part URL; ComponentLink3URL: https://lcsc.com/product-detail/Multilayer-Ceramic-Capacitors-MLCC---SMD-SMT_Murata-Electronics-Murata-Electronics-GCM1885C1H120FA16D_C126545.html
footprint CAP-0603 (0603 (1608M) Capacitor)
pins: 1, 2

## GCM1885C1H120JA16D
designator C?  Capacitance: 12pF  (hidden comment: *)
Capacitor, Ceramic (MLCC), 12pF, ±5%, 50V, C0G, ±5%, SMD 0603; Manufacturer: Murata Electronics; Manufacturer Part Number: GCM1885C1H120JA16D; Package Size: 0603; JLCPCB Basic Part: No; JLCPCB Part Number: C126546; Supplier 1: LCSC; Category: Capacitors - MLCC; Supplier Part Number 1: C126546; Tolerance: ±5%; Voltage Rating: 50V; Temperature Coefficient: C0G; RoHS: Yes; ComponentLink1Description: Datasheet; ComponentLink1URL: https://wmsc.lcsc.com/wmsc/upload/file/pdf/v2/lcsc/1810311125_Murata-Electronics-GCM1885C1H120JA16D_C126546.pdf; ComponentLink2Description: JLCPCB Part URL; ComponentLink2URL: https://jlcpcb.com/partdetail/C126546; ComponentLink3Description: LCSC Part URL; ComponentLink3URL: https://lcsc.com/product-detail/Multilayer-Ceramic-Capacitors-MLCC---SMD-SMT_Murata-Electronics-Murata-Electronics-GCM1885C1H120JA16D_C126546.html
footprint CAP-0603 (0603 (1608M) Capacitor)
pins: 1, 2

## GCM1885C1H121JA16D
designator C?  Capacitance: 120pF  (hidden comment: *)
Capacitor, Ceramic (MLCC), 120pF, ±5%, 50V, C0G, ±5%, SMD 0603; Manufacturer: Murata Electronics; Manufacturer Part Number: GCM1885C1H121JA16D; Package Size: 0603; JLCPCB Basic Part: No; JLCPCB Part Number: C126547; Supplier 1: LCSC; Category: Capacitors - MLCC; Supplier Part Number 1: C126547; Tolerance: ±5%; Voltage Rating: 50V; Temperature Coefficient: C0G; RoHS: Yes; ComponentLink1Description: Datasheet; ComponentLink1URL: https://wmsc.lcsc.com/wmsc/upload/file/pdf/v2/lcsc/1810311141_Murata-Electronics-GCM1885C1H121JA16D_C126547.pdf; ComponentLink2Description: JLCPCB Part URL; ComponentLink2URL: https://jlcpcb.com/partdetail/C126547; ComponentLink3Description: LCSC Part URL; ComponentLink3URL: https://lcsc.com/product-detail/Multilayer-Ceramic-Capacitors-MLCC---SMD-SMT_Murata-Electronics-Murata-Electronics-GCM1885C1H121JA16D_C126547.html
footprint CAP-0603 (0603 (1608M) Capacitor)
pins: 1, 2